# Altium footprint library Cap.PcbLib: 31 footprints (part 1 of 2)
Each footprint in its own frame and in the unit in brackets; x right, y up, seen from the top. Pads: shape width x height; smd on the part's side, far side on the other; paste and mask are expansions set on the pad; w line width, h text height; cw(c..) or ccw(c..) is an arc to the next point about the centre after c.
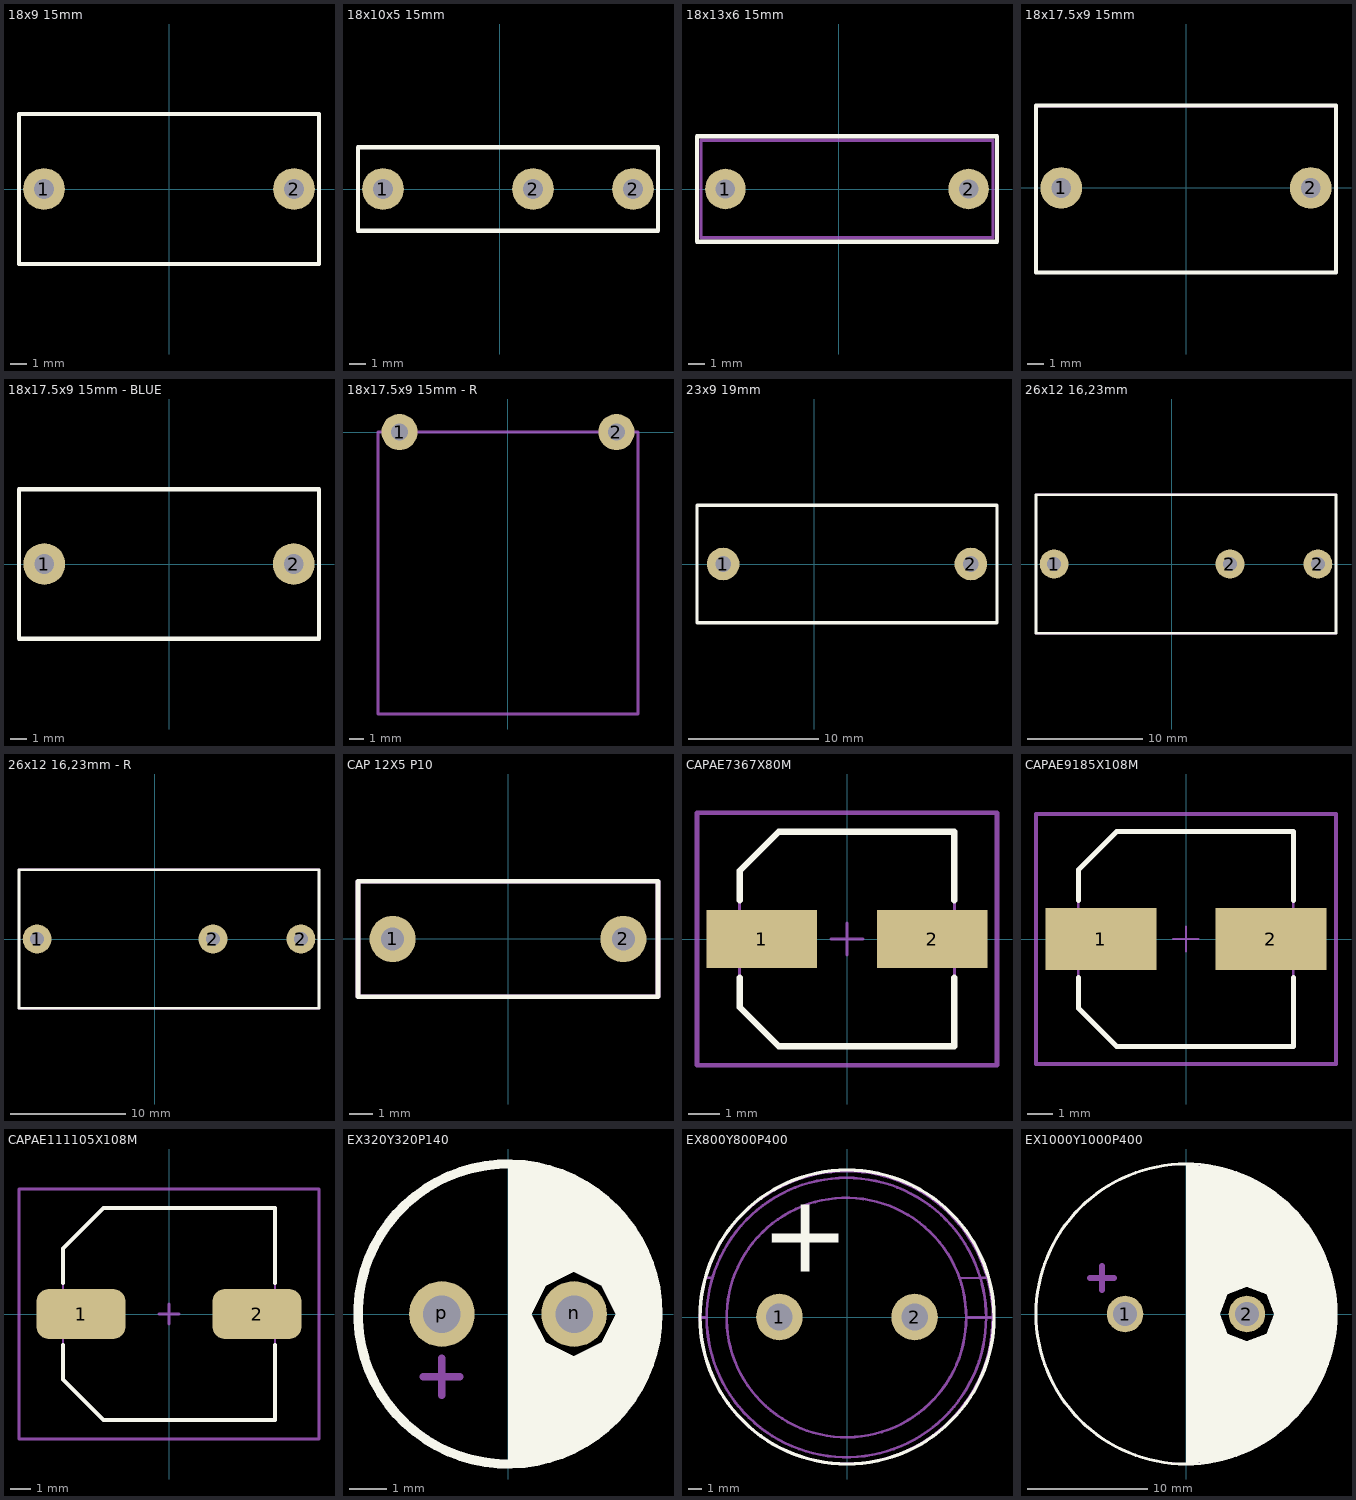
[diagram p0: the footprints below, top view; thin cyan lines are the x and y axes]

## 18x9 15mm [mm]
pads (2):
  round 2.5 hole 1.2: 1(-7.5,0) 2(7.5,0)
Top Overlay:
  lines w0.254: -9,-4.5 9,-4.5 9,4.5 -9,4.5 -9,-4.5
Mechanical 3:
  text ".Designator / .Comment" at -2.159,-0.762 h1.02
Mechanical 13:
  lines w0.178: -9,-4.5 9,-4.5 9,4.5 -9,4.5 -9,-4.5
3D body "User Library-CBB81_W18_5_H14_0_T9_0_P15_0.STEP": height 20, standoff -7, extent -9.249,-4.5 9.25,4.5

## 18x10x5 15mm [mm]
pads (3):
  round 2.5 hole 1.2: 1(-7,0) 2(2,0) 2(8,0)
Top Overlay:
  lines w0.254: -8.5,-2.5 -8.5,2.5 9.5,2.5 9.5,-2.5 -8.5,-2.5
Mechanical 3:
  text ".Designator / .Comment" at -4.659,-0.762 h1.02
Mechanical 13:
  lines w0.2: -8.5,-2.5 9.5,-2.5 9.5,2.5 -8.5,2.5 -8.5,-2.5
3D body: height 10, standoff 0, extent -8.5,-2.5 9.5,2.5

## 18x13x6 15mm [mm]
pads (2):
  round 2.5 hole 1.2: 1(-7,0) 2(8,0)
Top Overlay:
  lines w0.254: -8.75,-3.25 -8.75,3.25 9.75,3.25 9.75,-3.25 -8.75,-3.25
Mechanical 3:
  text ".Designator / .Comment" at -4.159,-0.762 h1.02
Mechanical 13:
  lines w0.2: -8.5,-3 9.5,-3 9.5,3 -8.5,3 -8.5,-3
3D body: height 13, standoff 0, extent -8.5,-3 9.5,3

## 18x17.5x9 15mm [mm]
pads (2):
  round 2.5 hole 1.2: 1(-7.5,0) 2(7.5,0)
Top Overlay:
  lines w0.254: -9.017,-5.08 9.017,-5.08 9.017,4.953 -9.017,4.953 -9.017,-5.08
Mechanical 3:
  text ".Designator / .Comment" at -2.159,-0.762 h1.02
Mechanical 13:
  lines w0.2: -9,-5.08 9,-5.08 9,4.921 -9,4.921 -9,-5.08
3D body "User Library-Hua Jung MKP-824K0305AB1151-P.step": height 19.5, standoff -1.81, extent -9,-5.08 9,4.921

## 18x17.5x9 15mm - BLUE [mm]
pads (2):
  round 2.5 hole 1.2: 1(-7.5,0) 2(7.5,0)
Top Overlay:
  lines w0.254: -9.017,-4.5 -9.017,4.5 9.017,4.5 9.017,-4.5 -9.017,-4.5
Mechanical 3:
  text ".Designator / .Comment" at -2.159,-0.762 h1.02
Mechanical 13:
  lines w0.2: -9,-4.5 -9,4.5 9,4.5 9,-4.5 -9,-4.5
3D body "User Library-CAP X2-9X17_5X18.STEP": height 17.5, standoff -2, extent -9,-4.5 9,4.5

## 18x17.5x9 15mm - R [mm]
pads (2):
  round 2.5 hole 1.2: 1(-7.5,0) 2(7.5,0)
Mechanical 3:
  text ".Designator / .Comment" at -2.159,-1.762 h1.02
Mechanical 13:
  lines w0.2: -9,-19.5 -9,0 9,0 9,-19.5 -9,-19.5
3D body "User Library-CAP X2-9X17_5X18.STEP": height 12, standoff 3, extent -9,-19.5 9,0

## 23x9 19mm [mm]
pads (2):
  round 2.5 hole 1.2: 1(-7,0) 2(12,0)
Top Overlay:
  lines w0.254: -9,-4.5 -9,4.5 14,4.5 14,-4.5 -9,-4.5
Mechanical 3:
  text ".Designator / .Comment" at -2.159,-0.762 h1.02
Mechanical 13:
  lines w0.178: -9,-4.5 -9,4.5 14,4.5 14,-4.5 -9,-4.5
3D body "User Library-CBB81_W23_0_H16_0_T9_0_P19_0.STEP": height 19, standoff -10, extent -8.998,-4.5 14,4.5

## 26x12 16,23mm [mm]
pads (3):
  round 2.5 hole 1.2: 1(-10.215,0) 2(5.025,0) 2(12.645,0)
Top Overlay:
  lines w0.254: -11.785,-6 14.215,-6 14.215,6 -11.785,6 -11.785,-6
Mechanical 3:
  text ".Designator / .Comment" at -4.659,-0.762 h1.02
Mechanical 13:
  lines w0.178: -11.785,-6 14.215,-6 14.215,6 -11.785,6 -11.785,-6
3D body: height 18.1, standoff 0, extent -11.785,-6 14.25,6

## 26x12 16,23mm - R [mm]
pads (3):
  round 2.5 hole 1.2: 1(-10.215,0) 2(5.025,0) 2(12.645,0)
Top Overlay:
  lines w0.254: -11.785,-6 -11.785,6 14.215,6 14.215,-6 -11.785,-6
Mechanical 3:
  text ".Designator / .Comment" at -4.659,-0.762 h1.02
Mechanical 13:
  lines w0.178: -11.785,-6 -11.785,6 14.215,6 14.215,-6 -11.785,-6
3D body: height 18.1, standoff 0, extent -11.785,-6 14.25,6

## CAP 12X5 P10 [mm]
height 10
pads (2):
  round 2 hole 1: 1(-5,0) 2(5,0)
Top Overlay:
  lines w0.2: -6.5,-2.5 -6.5,2.5 6.5,2.5 6.5,-2.5 -6.5,-2.5
Mechanical 13:
  lines w0.2: -6.5,-2.5 ccw(c-6.5,-2.5) -6.5,-2.5 ; -6.5,-2.5 6.5,-2.5 ; -6.5,-2.5 -6.5,2.5 ; -6.5,2.5 ccw(c-6.5,2.5) -6.5,2.5 ; -6.5,2.5 6.5,2.5 ; 6.5,-2.5 ccw(c6.5,-2.5) 6.5,-2.5 ; 6.5,-2.5 6.5,2.5 ; 6.5,2.5 ccw(c6.5,2.5) 6.5,2.5
3D body: height 10, standoff 0.2, extent -6.5,-2.5 6.5,2.5

## CAPAE7367X80M [mm] "Aluminum Electrolytic Capacitor, Body 6,70x6,70x8,00mm, IPC Low Density"
height 8
pads (2):
  rect 3.5x1.85 smd: 1(-2.7,0) 2(2.7,0)
Top Overlay:
  lines w0.2: -3.4,-1.225 -3.4,-2.163 -2.163,-3.4 3.4,-3.4 3.4,-1.225 ; -3.4,1.225 -3.4,2.163 -2.163,3.4 3.4,3.4 3.4,1.225
Mechanical 13:
  lines w0.1: -3.4,-2.163 -2.163,-3.4 3.4,-3.4 3.4,3.4 -2.163,3.4 -3.4,2.163 -3.4,-2.163
Mechanical 15:
  lines w0.1: -0.5,0 0.5,0 ; 0,-0.5 0,0.5
  lines w0.15: -4.75,-4 -4.75,4 4.75,4 4.75,-4 -4.75,-4
3D body "CAPAE7367X80M.step": height 8, standoff 0, extent -3.65,-3.4 3.65,3.4

## CAPAE9185X108M [mm] "Aluminum Electrolytic Capacitor, Body 8,50x8,50x10,80mm, IPC Low Density"
height 10.8
pads (2):
  rect 4.45x2.5 smd: 1(-3.4,0) 2(3.4,0)
Top Overlay:
  lines w0.2: -4.3,-1.55 -4.3,-2.775 -2.775,-4.3 4.3,-4.3 4.3,-1.55 ; -4.3,1.55 -4.3,2.775 -2.775,4.3 4.3,4.3 4.3,1.55
Mechanical 13:
  lines w0.1: -4.3,-2.775 -4.3,2.775 -2.775,4.3 4.3,4.3 4.3,-4.3 -2.775,-4.3 -4.3,-2.775
Mechanical 15:
  lines w0.1: -0.5,0 0.5,0 ; 0,-0.5 0,0.5
  lines w0.15: -6,-5 6,-5 6,5 -6,5 -6,-5
3D body "CAPAE9185X108M.step": height 10.8, standoff 0, extent -4.55,-4.3 4.55,4.3

## CAPAE111105X108M [mm] "Aluminum Electrolytic Capacitor, Body 10,50x10,50x10,80mm, IPC Low Density"
height 10.8
pads (2):
  rrect50% 4.45x2.5 smd: 1(-4.4,0) 2(4.4,0)
Top Overlay:
  lines w0.2: -5.3,-1.55 -5.3,-3.275 -3.275,-5.3 5.3,-5.3 5.3,-1.55 ; -5.3,1.55 -5.3,3.275 -3.275,5.3 5.3,5.3 5.3,1.55
Mechanical 13:
  lines w0.1: -5.3,-3.275 -5.3,3.275 -3.275,5.3 5.3,5.3 5.3,-5.3 -3.275,-5.3 -5.3,-3.275
Mechanical 15:
  lines w0.15: -0.5,0 0.5,0 ; 0,-0.5 0,0.5 ; -7.5,-6.25 7.5,-6.25 7.5,6.25 -7.5,6.25 -7.5,-6.25
3D body "CAPAE111105X108M.step": height 10.8, standoff 0, extent -5.55,-5.3 5.55,5.3

## EX320Y320P140 [mil]
pads (2):
  round 70 hole 40: n(70.47,0) p(-70.47,0)
Top Overlay:
  circle w10: c0,0 r160
  region: 25,0 40,30 70,45 100,30 115,0 160,0 150,60 115,115 70,145 0,160 0,0
  region: 0,0 0,-160 70,-145 115,-115 150,-60 160,0 115,0 100,-30 70,-45 40,-30 25,0
Mechanical 3:
  text ".Designator / .Comment" at -85,45 h40
Mechanical 13:
  circle w10: c-70.47,0 r10
  circle w10: c70.47,0 r10
  circle w7.01: c0,0 r160
  lines w7.87: -90.55,-66.93 -51.18,-66.93 ; -70.87,-86.61 -70.87,-47.24
3D body "User Library-Cap-EL(8x12-3_5)T.step": height 494.33, standoff -119.92, extent -153.54,-157.47 161.5,157.48

## EX800Y800P400 [mm]
pads (2):
  round 3.5 hole 2 paste-25.4: 1(-5.08,0) 2(5.08,0)
Top Overlay:
  circle w0.254: c0,0 r11.045
  text "+" at -6.5,1.5 h10
Mechanical 13:
  lines w0.2: -11.046,-0.037 cw(c-0.046,-0.037) -10.629,2.963 ; -11.046,-0.037 ccw(c-0.046,-0.037) 10.954,-0.037 ; -11.046,-0.037 -10.546,-0.037 ; -10.629,2.963 cw(c-0.046,-0.037) 10.537,2.963 ; -10.629,2.963 -10.109,2.963 ; -10.546,-0.037 ccw(c-0.046,-0.037) 10.454,-0.037 ; -10.546,-0.037 cw(c-0.046,-0.037) -10.109,2.963 ; -10.109,2.963 cw(c-0.046,-0.037) 10.016,2.963 ; 8.458,2.908 ccw(c-0.046,-0.037) 8.954,-0.037 ; 8.458,2.908 cw(c-0.046,-0.037) 8.954,-0.037 ; 8.458,2.908 10.016,2.963 ; 8.954,-0.037 10.454,-0.037 ; 10.016,2.963 cw(c-0.046,-0.037) 10.454,-0.037 ; 10.016,2.963 10.537,2.963 ; 10.454,-0.037 10.954,-0.037 ; 10.537,2.963 cw(c-0.046,-0.037) 10.954,-0.037
  text "+" at -6.5,1.7 h10
3D body "User Library-ECEC2DP271BJ.SLDPRT": height 25, standoff 0, extent -11,-11 11,11

## EX1000Y1000P400 [mil]
pads (2):
  round 120 hole 80: 1(-200,0) 2(200,0)
Top Overlay:
  circle w10: c0,0 r492.13
  region: 0,0 0,-490 120,-480 260,-420 350,-350 440,-220 480,-110 490,0 290,0 265,-65 200,-90 135,-65 110,0
  region: 110,0 135,65 200,90 265,65 290,0 490,0 480,110 440,220 350,350 260,420 120,480 0,490 0,0
Mechanical 3:
  text ".Designator / .Comment" at -85,-25 h40
Mechanical 13:
  circle w10: c-200,0 r15
  circle w10: c200,0 r15
  circle w7.01: c0,0 r492.13
  lines w19.68: -314.96,118.11 -236.22,118.11 ; -275.59,78.74 -275.59,157.48
3D body "User Library-CE_R530_D1000_H1750.step": height 1661.42, standoff -98.43, extent -495,-500 505,500